# Altium footprint library PART.PcbLib: 407 footprints (part 16 of 26)
Each footprint in its own frame and in the unit in brackets; x right, y up, seen from the top. Pads: shape width x height; smd on the part's side, far side on the other; paste and mask are expansions set on the pad; w line width, h text height; cw(c..) or ccw(c..) is an arc to the next point about the centre after c.
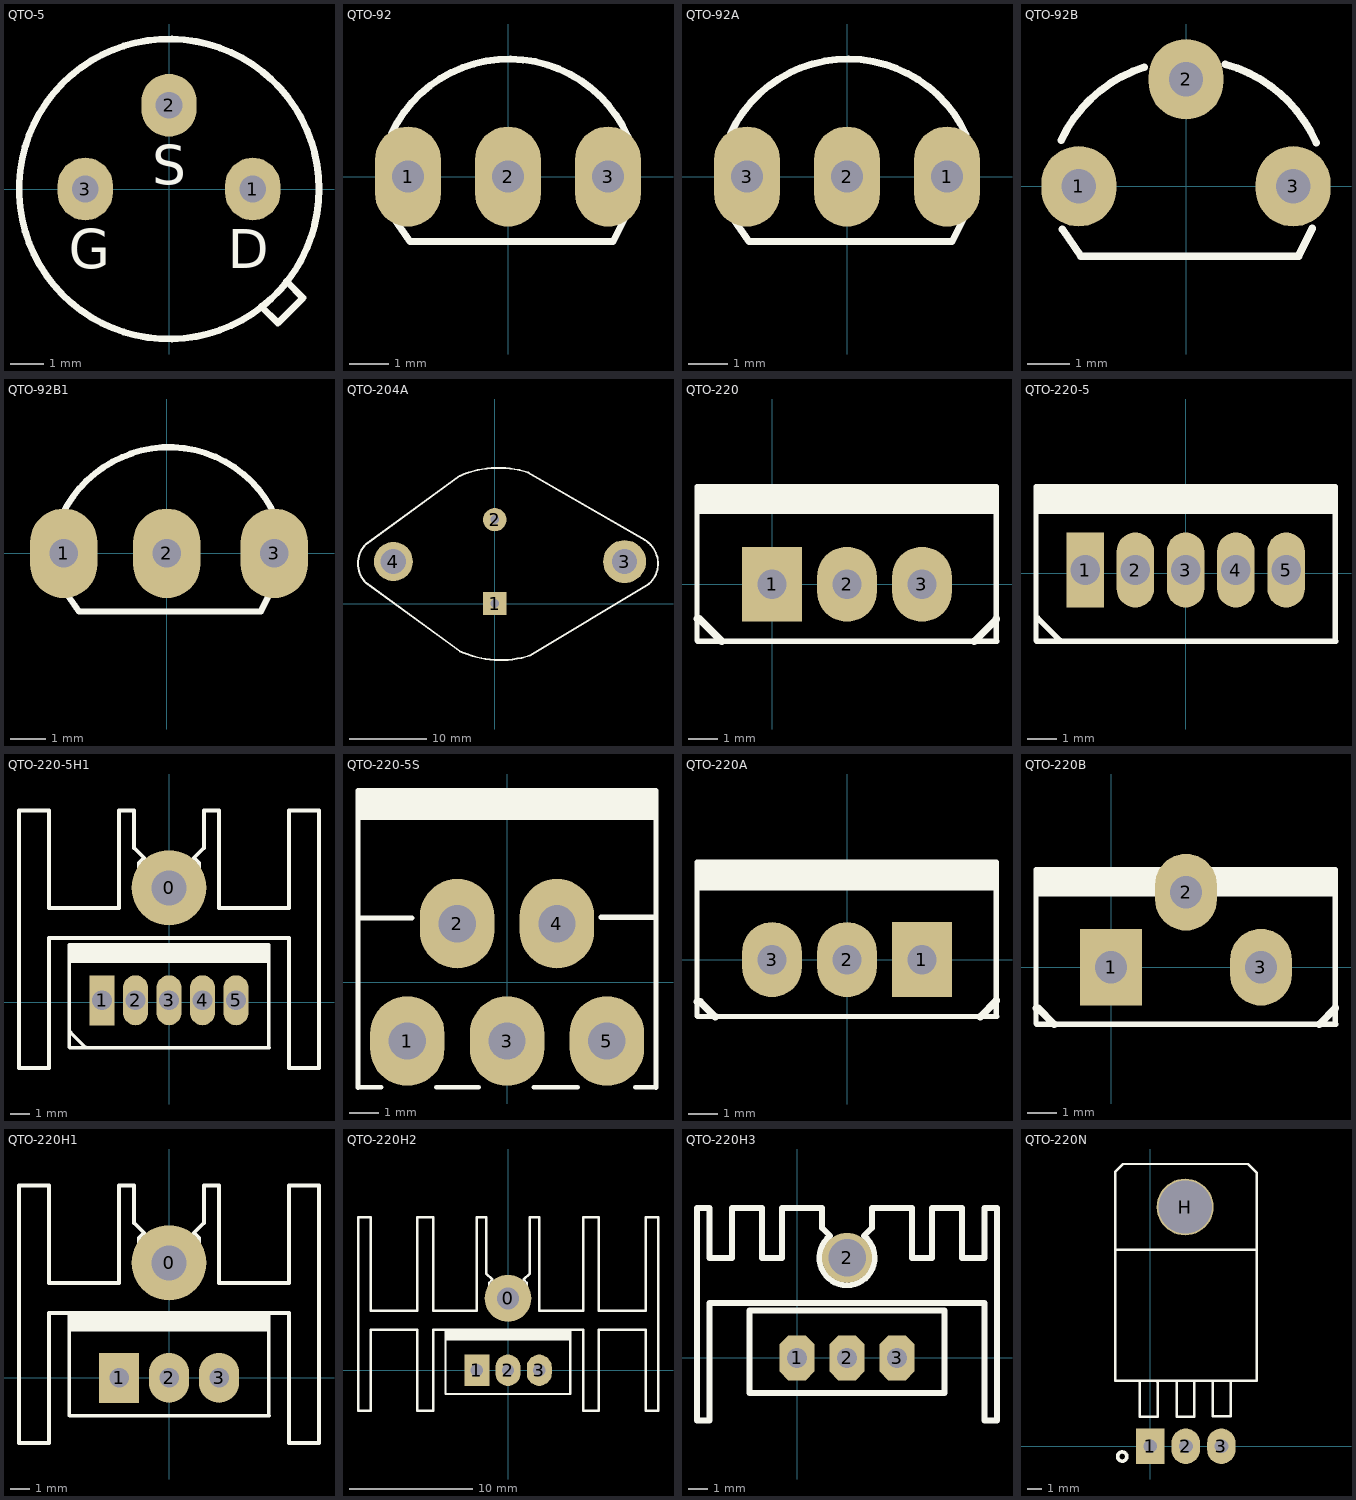
[diagram p15: the footprints below, top view; thin cyan lines are the x and y axes]

## QTO-5 [mil] "TO-5"
height 200
pads (3):
  oval 66x75 hole 32: 1(100,0) 2(0,100) 3(-100,0)
Top Overlay:
  circle w8: c0,0 r179.13
  lines w8: 110,-140 130,-160 160,-130 140,-110
  text "D" at 70,-110 h80
  text "G" at -120,-110 h80
  text "S" at -20,-10 h80

## QTO-92 [mil] "TO-92"
height 200
pads (3):
  oval 66x100 hole 32: 1(-100,0) 2(0,0) 3(100,0)
Top Overlay:
  lines w7: -116.52,43.21 cw(c0.97,-12.43) 119.94,39.97 ; -115.34,-40.24 -98,-65 105,-65 118,-39
3D body: height 385.04, standoff -59.79, extent -108.87,-65.56 108.87,95

## QTO-92A [mil] "TO-92"
height 200
pads (3):
  oval 66x100 hole 32: 1(100,0) 2(0,0) 3(-100,0)
Top Overlay:
  lines w7: -116.52,43.21 cw(c0.97,-12.43) 119.08,41.88 ; -115.34,-40.24 -98,-65 105,-65 118,-39
3D body: height 385.04, standoff -59.79, extent -110,-60.56 107.74,100

## QTO-92B [mil] "TO-92"
height 200
pads (3):
  oval 70x75 hole 32: 1(-100,0) 2(0,100) 3(100,0)
Top Overlay:
  lines w7: -116.52,43.21 cw(c0.97,-12.43) -38.82,111.34 ; -115.34,-40.24 -98,-65 105,-65 118,-39 ; 36.81,113.84 cw(c2.42,-11.53) 121.49,40.65

## QTO-92B1 [mil] "TO-92"
height 200
pads (3):
  oval 75x100 hole 32: 1(-115,0) 2(0,0) 3(120,0)
Top Overlay:
  lines w7: -116.52,43.21 cw(c0.97,-12.43) -38.82,111.34 ; -115.34,-40.24 -98,-65 105,-65 118,-39 ; -40.42,111.21 cw(c2.42,-11.53) 121.49,40.65
3D body: height 385.04, standoff -59.79, extent -112.74,-65.56 105,95

## QTO-204A [mil] "Pin For 2N3055, 2N2955"
pads (4):
  rect 120x120 hole 45: 1(0,0)
  round 120 hole 45: 2(0,430)
  round 220 hole 130: 3(665,215)
  round 200 hole 130: 4(-520,215)
Top Overlay:
  lines w10: -660,105 cw(c-560,205) -660,305 -179.46,654.16 ; -659.88,104.89 -178.69,-244.72 ; -179.53,654.34 cw(c18.37,195.17) 171.59,671.11 ; -178.9,-245.19 ccw(c28.37,209.83) 180.47,-266.47 ; 171.46,670.71 769.34,325.52 ; 180.28,-266.15 789.88,100.13 ccw(c695,205) 769.25,325.36
3D body: height 350.39, standoff -472.44, extent -688,-298.62 857.53,725

## QTO-220 [mil] "TO-220 - 1-2-3"
height 200
pads (3):
  rect 80x100 hole 39: 1(0,0)
  oval 80x100 hole 39: 2(100,0) 3(200,0)
Top Overlay:
  rectangle: -99,94 300,130
  lines w7: 298,107 299,93 ; -100,-75 -100,130 299,130 299,-75 300,-76 -76,-76 -99,-76 -100,-75
  lines w10: -100,-46 -97,-46 -67,-76 ; 270,-76 299,-47 299,-46
3D body: height 904.72, standoff -250, extent -119,-64 322.46,120.65

## QTO-220-5 [mil] "TO-220 - 1-2-3"
height 200
pads (5):
  rect 50x100 hole 39.37: 1(-134,4)
  oval 50x100 hole 39.37: 2(-67,4) 3(0,4) 4(67,4) 5(134,4)
Top Overlay:
  rectangle: -198.5,79 200.5,115
  lines w7: 198.5,92 199.5,78 ; 199.5,-90 199.5,115 -199.5,115 -199.5,-90 -198.5,-91 -175.5,-91 200.5,-91
  lines w8: -197.5,-60 -167.5,-90
3D body: height 904.72, standoff -250, extent -218.5,-79 222.96,105.65

## QTO-220-5H1 [mil] "TO-220 - 1-2-3"
height 200
pads (6):
  round 150 hole 70: 0(0,229)
  rect 50x100 hole 39.37: 1(-134,4)
  oval 50x100 hole 39.37: 2(-67,4) 3(0,4) 4(67,4) 5(134,4)
Top Overlay:
  rectangle: -198.5,79 200.5,115
  lines w7: 198.5,92 199.5,78 ; 199.5,-90 199.5,115 -199.5,115 -199.5,-90 -198.5,-91 -175.5,-91 200.5,-91
  lines w8: -197.5,-60 -167.5,-90 ; -300,-131 -300,384 -240,384 -240,189 -100,189 -100,384 -70,384 -70,309 -50,289 -60,279 -60,209 -40,189 40,189 60,209 60,279 50,289 70,309 70,384 100,384 100,189 240,189 240,384 300,384 300,-131 240,-131 240,129 -240,129 -240,-131 -300,-131
3D body: height 904.72, standoff -250, extent -218.5,-79 222.96,105.65

## QTO-220-5S [mm]
pads (5):
  oval 2.54x3.048 hole 1.27: 1(-3.4,-2) 2(-1.7,2) 3(0,-2) 4(1.7,2) 5(3.4,-2)
Top Overlay:
  rectangle: -4.991,5.537 5.143,6.452
  lines w0.152: -5.08,-3.581 -4.293,-3.581 ; -2.413,-3.581 -0.965,-3.581 ; 0.914,-3.581 2.413,-3.581 ; 4.369,-3.581 5.08,-3.581
  lines w0.178: -5.08,-3.581 -5.08,6.534 5.08,6.534 5.08,-3.581 ; -5.076,2.191 -3.248,2.191 ; 3.204,2.216 5.033,2.216

## QTO-220A [mil] "TO-220 - 3-2-1"
height 200
pads (3):
  rect 80x100 hole 39: 1(100,0)
  oval 80x100 hole 39: 2(0,0) 3(-100,0)
Top Overlay:
  rectangle: -200,92 199,131
  lines w7: 198,107 199,93 ; -200,-75 -200,130 199,130 199,-75 200,-76 -176,-76 -199,-76 -200,-75
  lines w10: -200,-56 -196,-56 -176,-76 ; 178,-76 199,-55 199,-54
3D body: height 910.24, standoff -222.83, extent -194.88,-81 194.88,96.17

## QTO-220B [mm] "TO-220 - 1-2-3"
height 5.08
pads (3):
  rect 2.1x2.6 hole 1.1: 1(0,0)
  oval 2.1x2.6 hole 1.1: 2(2.54,2.54) 3(5.08,0)
Top Overlay:
  rectangle: -2.515,2.388 7.62,3.302
  lines w0.178: 7.569,2.718 7.595,2.362 ; -2.54,-1.905 -2.54,3.302 7.595,3.302 7.595,-1.905 7.62,-1.93 -1.93,-1.93 -2.515,-1.93 -2.54,-1.905
  lines w0.254: -2.54,-1.397 -2.464,-1.397 -1.93,-1.93 ; 7.061,-1.93 7.595,-1.397 7.595,-1.372
3D body: height 20.58, standoff -8.2, extent -2.356,-2.062 7.544,2.438

## QTO-220H1 [mil] "TO-220 - 1-2-3"
height 200
pads (4):
  round 150 hole 70: 0(0,230)
  rect 80x100 hole 39: 1(-100,0)
  oval 80x100 hole 39: 2(0,0) 3(100,0)
Top Overlay:
  rectangle: -201,93 198,129
  lines w7: -200,100 198.5,100 199,93 ; -200,-75 -200,130 199,130 199,-75 200,-76 -176,-76 -199,-76 -200,-75
  lines w8: -300,-130 -240,-130 -240,130 240,130 240,-130 300,-130 300,385 240,385 240,190 100,190 100,385 70,385 70,310 50,290 60,280 60,210 40,190 -40,190 -60,210 -60,280 -50,290 -70,310 -70,385 -100,385 -100,190 -240,190 -240,385 -300,385 -300,-130
3D body: height 850.24, standoff -282.83, extent -194.88,-82 194.88,95.17
3D body: height 1000, standoff -122.05, extent -246,73.03 250.06,328.97

## QTO-220H2 [mil] "TO-220 - 1-2-3"
height 200
pads (4):
  round 150 hole 70: 0(0,230)
  rect 80x100 hole 39: 1(-100,0)
  oval 80x100 hole 39: 2(0,0) 3(100,0)
Top Overlay:
  rectangle: -201,95 198,131
  lines w7: -200,100 198.5,100 199,93 ; -200,-75 -200,130 199,130 199,-75 200,-76 -176,-76 -199,-76 -200,-75
  lines w8: -480,-130 -440,-130 -440,130 -290,130 -290,-130 -240,-130 -240,130 240,130 240,-130 290,-130 290,130 440,130 440,-130 480,-130 480,490 440,490 440,190 290,190 290,490 240,490 240,190 100,190 100,490 70,490 70,310 50,290 60,280 60,210 40,190 -40,190 -60,210 -60,280 -50,290 -70,310 -70,490 -100,490 -100,190 -240,190 -240,490 -290,490 -290,190 -440,190 -440,490 -480,490 -480,-130
3D body: height 1205.51, standoff 0, extent -448.79,-177 452.79,468.67
3D body: height 810.24, standoff -322.83, extent -194.76,-82.17 195,95

## QTO-220H3 [mil] "TO-220 1-2-3"
pads (4):
  oct 70x90 hole 40: 1(0,0) 2(100,0) 3(200,0)
  round 100 hole 75: 2(100,200)
Top Overlay:
  lines w12: 66,244 50,260 50,300 -30,300 -30,200 -70,200 -70,300 -130,300 -130,200 -175,200 -175,300 -200,300 -200,-125 -175,-125 -175,110 375,110 375,-125 400,-125 400,300 375,300 375,200 330,200 330,300 270,300 270,200 230,200 230,300 150,300 150,260 133.59,243.59 ; 66.37,243.52 ccw(c100,200) 133.77,243.41 ; -95,-70 295,-70 295,95 -95,95 -95,-70
3D body: height 322.83, standoff -810.24, extent -96.88,-76.17 292.88,101
3D body: height 984.25, standoff -149.61, extent -189.97,-102.25 391.97,323

## QTO-220N [mil] "TO-220 - 1-2-3"
height 200
pads (4):
  rect 80x100 hole 39: 1(0,0)
  oval 80x100 hole 39: 2(100,0) 3(200,0)
  round 160 hole 150: H(98,673)
Top Overlay:
  circle w10: c-79.03,-29 r12.97
  lines w7: -99,549 -99,772 -77,794 275,794 300,769 300,730 ; -99,552 -99,184 300,184 300,553 -98,553 ; -29,178 -29,83 21,83 21,180 20,181 ; 74,178 74,83 124,83 124,180 123,181 ; 176,180 176,85 226,85 226,182 225,183 ; 300,552 300,733
3D body: height 121, standoff -160, extent -48,-10.31 252,792.31